# Altium footprint library cool_library.PcbLib: 1182 footprints (part 71 of 75)
Each footprint in its own frame and in the unit in brackets; x right, y up, seen from the top. Pads: shape width x height; smd on the part's side, far side on the other; paste and mask are expansions set on the pad; w line width, h text height; cw(c..) or ccw(c..) is an arc to the next point about the centre after c.
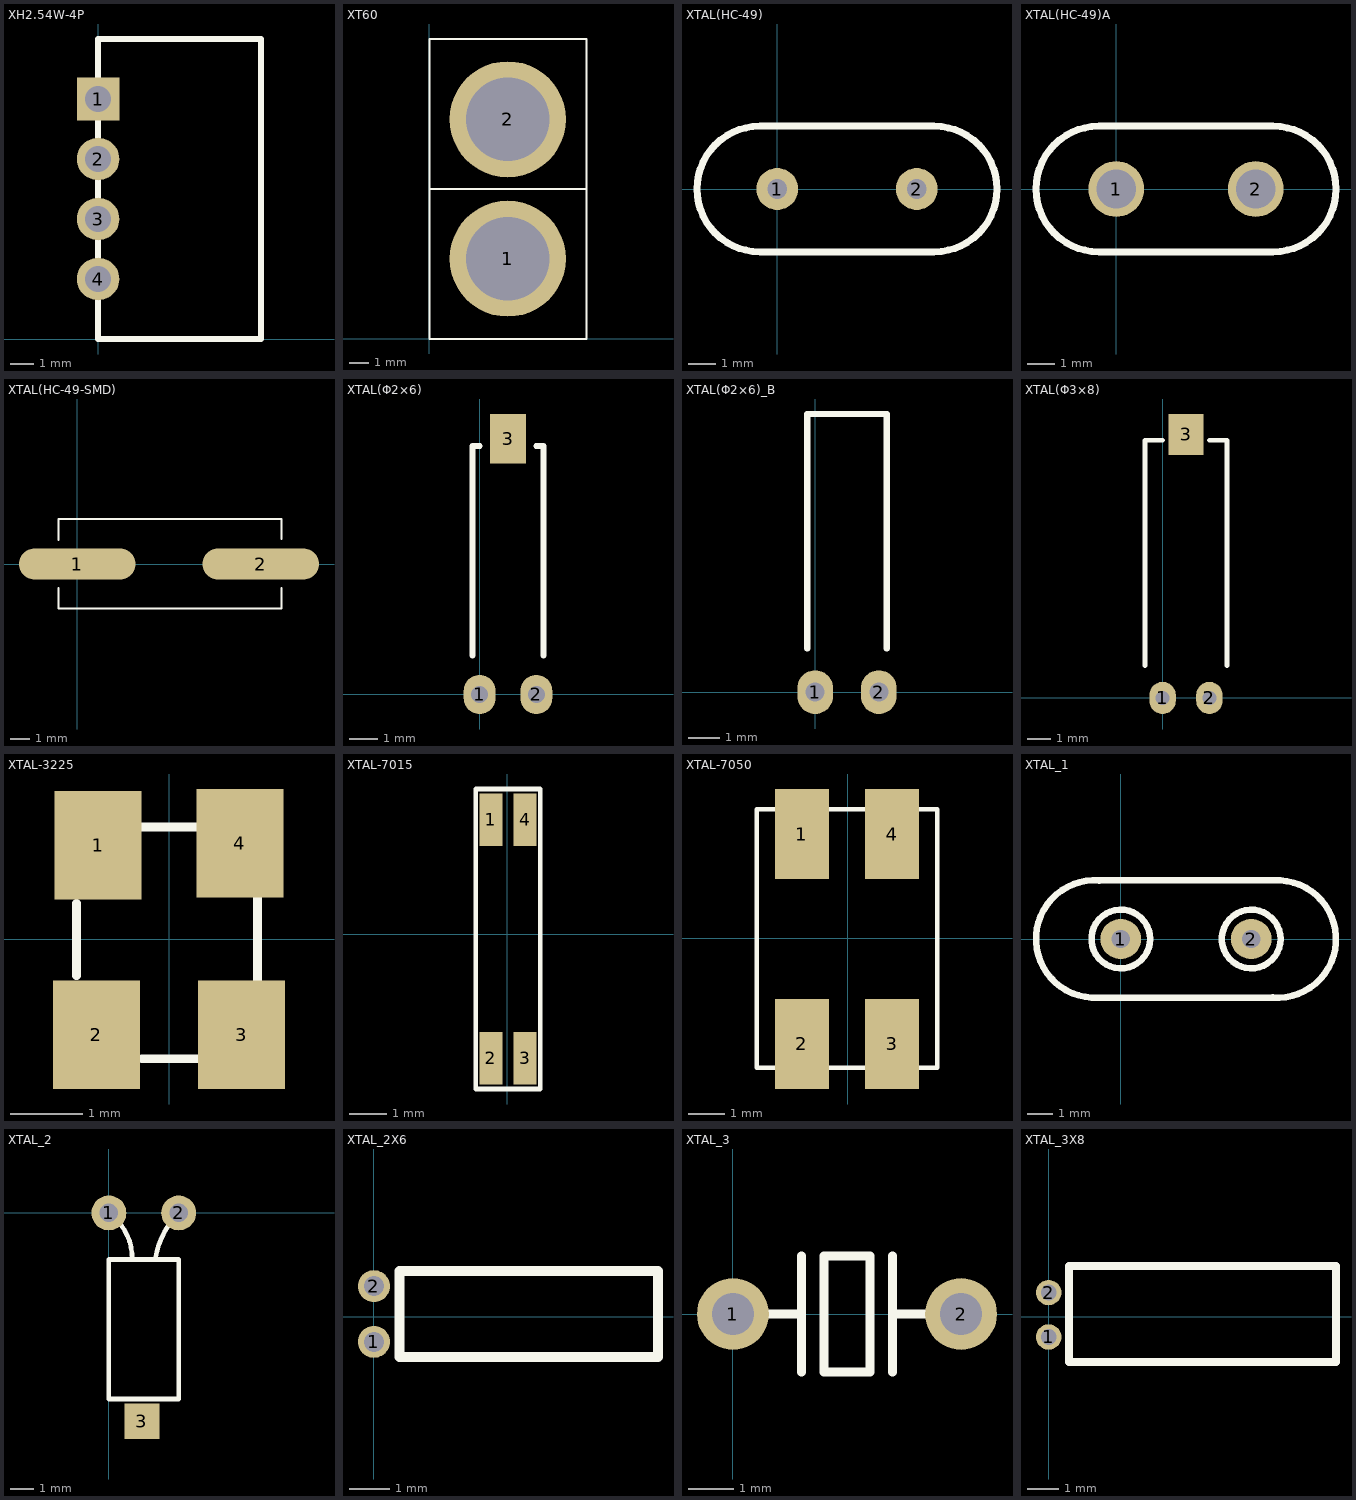
[diagram p70: the footprints below, top view; thin cyan lines are the x and y axes]

## XH2.54W-4P [mm]
pads (4):
  rect 1.8x1.8 hole 1.1: 1(0,10.16)
  round 1.8 hole 1.1: 2(0,7.62) 3(0,5.08) 4(0,2.54)
Top Overlay:
  lines w0.254: 6.858,0 2.032,0 0,0 0,12.7 0.762,12.7 6.9,12.7 6.9,0

## XT60 [mm]
pads (2):
  round 6 hole 4.3: 1(4.05,4.15) 2(4.05,11.35)
Top Overlay:
  lines w0.1: 0,7.75 8.128,7.75 ; 0,15.494 8.1,15.494 ; 0,15.5 0,0 8.1,0 ; 8.128,0 8.128,15.5

## XTAL(HC-49) [mil]
pads (2):
  round 60 hole 28: 1(0,0) 2(200,0)
Top Overlay:
  lines w10: -25,-90 cw(c-25,0) -25,90 225,90 cw(c225,0) 225,-90 -25,-90

## XTAL(HC-49)A [mil]
pads (2):
  round 80 hole 56: 1(0,0) 2(200,0)
Top Overlay:
  lines w10: -25,-90 cw(c-25,0) -25,90 225,90 cw(c225,0) 225,-90 -25,-90

## XTAL(HC-49-SMD) [mil]
pads (2):
  oval 236x63 smd: 1(0,0) 2(371,0)
Top Overlay:
  lines w4: -38,-49 -38,-90 413,-90 413,-49 ; -38,49 -38,91 413,91 413,51

## XTAL(Φ2×6) [mil]
pads (3):
  oval 45x55 hole 24: 1(0,0) 2(80,0)
  rect 50x70 smd: 3(40,360)
Top Overlay:
  lines w8: -10,55 -10,350 0,350 ; 80,350 90,350 90,55

## XTAL(Φ2×6)_B [mil]
pads (2):
  oval 45x55 hole 24: 1(0,0) 2(80,0)
Top Overlay:
  lines w8: -10,55 -10,350 ; 0,350 -10,350 ; 90,55 90,350 80,350 -10,350

## XTAL(Φ3×8) [mil]
pads (3):
  oval 45x55 hole 24: 1(0,0) 2(80,0)
  rect 60x70 smd: 3(40,450)
Top Overlay:
  lines w8: -30,55 -30,440 0,440 ; 80,440 110,440 110,55

## XTAL-3225 [mm]
pads (4):
  rect 1.2x1.5 smd: 1(-0.978,1.295) 2(-1.003,-1.321) 3(1.003,-1.321) 4(0.978,1.321)
Top Overlay:
  lines w0.12: -1.278,-0.505 -1.278,0.495 ; -0.378,-1.655 0.422,-1.655 ; -0.378,1.545 0.422,1.545 ; 1.222,-0.605 1.222,0.595
3D body: height 0.8, standoff 0, extent -1.268,-1.651 1.232,1.549

## XTAL-7015 [mil]
pads (4):
  rect 23.62x55 smd: 1(-17,119) 2(-17,-129.03) 3(18.43,-129.03) 4(18.43,119)
Top Overlay:
  lines w4.72: -32.75,-161 34.18,-161 34.18,151 -32.75,151 -32.75,-161
3D body: height 51.18, standoff 0, extent -25,-148.9 26.18,136.9

## XTAL-7050 [mm]
pads (4):
  rect 1.5x2.5 smd: 1(-1.27,2.894) 2(-1.27,-2.922) 3(1.23,-2.922) 4(1.23,2.894)
Top Overlay:
  lines w0.12: -2.52,-3.581 -2.52,3.581 2.48,3.581 2.48,-3.581 -2.52,-3.581
3D body: height 1, standoff 0, extent -2.5,-3.449 2.5,3.551

## XTAL_1 [mil]
pads (2):
  round 62 hole 28: 1(0,0) 2(200,0)
Top Overlay:
  circle w10: c200,0 r45
  circle w10: c0,0 r45
  lines w10: -34.21,-89.81 cw(c-40,0) -32.82,89.71 ; -33.56,-90 232.82,-90 ; -32.02,90 234.21,90 ; 232.82,-89.71 ccw(c240,0) 234.21,89.81

## XTAL_2 [mm]
pads (3):
  round 1.5 hole 0.8: 1(0,0) 2(3,0)
  rect 1.524x1.524 smd: 3(1.422,-8.966)
Top Overlay:
  lines w0.2: 0,0 cw(c-1.433,-1.967) 1,-2 ; 2,-2 cw(c5.5,-2.5) 3,0 ; 0,-8 0,-2 3,-2 3,-8 0,-8

## XTAL_2X6 [mm]
pads (2):
  round 0.8 hole 0.5: 1(0,-0.635) 2(0,0.762)
Top Overlay:
  lines w0.254: 0.635,-1.016 0.635,1.143 7.112,1.143 7.112,-1.016 0.635,-1.016
3D body: height 2, standoff 0, extent 0.912,-0.94 6.912,1.052

## XTAL_3 [mil]
pads (2):
  round 62 hole 36: 1(0,0) 2(196.85,0)
Top Overlay:
  lines w7.87: 6.3,0 56.3,0 ; 59.05,-50 59.05,50 ; 137.79,-50 137.79,50 ; 140.55,0 190.55,0 ; 78.74,-50 118.11,-50 118.11,50 78.74,50 78.74,-50

## XTAL_3X8 [mm]
pads (2):
  round 0.8 hole 0.5: 1(0,-0.635) 2(0,0.762)
Top Overlay:
  lines w0.254: 0.635,-1.422 9.042,-1.422 9.042,1.6 0.635,1.6 0.635,-1.422
3D body: height 3, standoff 0, extent 0.912,-1.436 8.912,1.552